# Altium footprint library My Library.PcbLib: 872 footprints (part 43 of 55)
Each footprint in its own frame and in the unit in brackets; x right, y up, seen from the top. Pads: shape width x height; smd on the part's side, far side on the other; paste and mask are expansions set on the pad; w line width, h text height; cw(c..) or ccw(c..) is an arc to the next point about the centre after c.
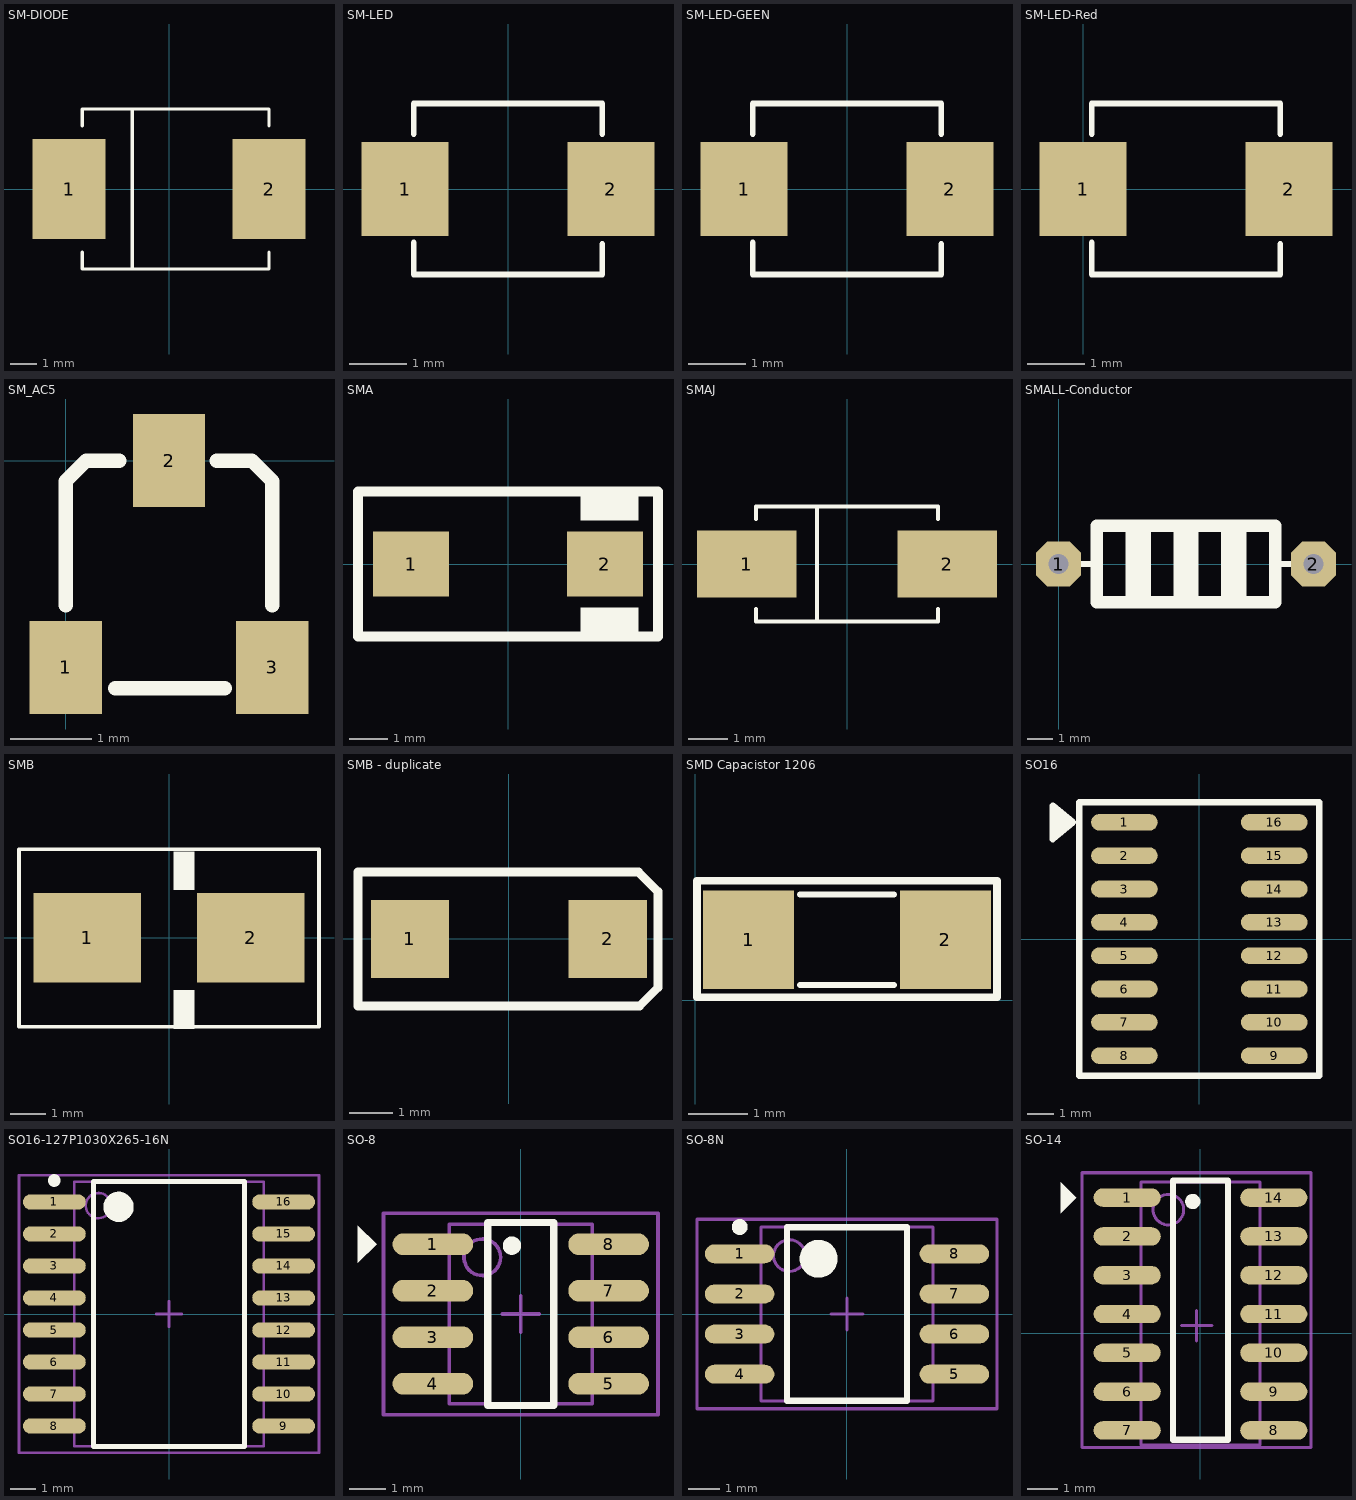
[diagram p42: the footprints below, top view; thin cyan lines are the x and y axes]

## SM-DIODE [mil] "Magnetic-Core Inductor with Winding Polarity Marking; 2 Leads"
pads (2):
  rect 110x150 smd: 1(-150,0) 2(150,0)
Top Overlay:
  lines w5: -130,-95 -130,-120 150,-120 150,-95 ; -130,95 -130,120 150,120 150,95 ; -55,-120 -55,120
Mechanical 1:
  lines w1: -130,-120 150,-120 ; -130,120 150,120
3D body "SW3DPS-DIOD SMD 10BF10-DEFAULT.STEP": height 96.27, standoff 0.6, extent -103.33,-72.86 105.33,68.87

## SM-LED [mil] "Compoment SMD 120x60mil"
height 50
pads (2):
  rect 60x65 smd: 1(-71,0) 2(71,0)
Top Overlay:
  lines w4: -65,-37 -65,-59 65,-59 65,-38 ; -65,38 -65,59 65,59 65,38

## SM-LED-GEEN [mil] "Compoment SMD 120x60mil"
height 50
pads (2):
  rect 60x65 smd: 1(-71,0) 2(71,0)
Top Overlay:
  lines w4: -65,-37 -65,-59 65,-59 65,-38 ; -65,38 -65,59 65,59 65,38
3D body "SW3dPS-LED1206G.STEP": height 43.81, standoff -15.9, extent -63,-32 63,31

## SM-LED-Red [mil]
pads (2):
  rect 60x65 smd: 1(0,0) 2(142,0)
Top Overlay:
  lines w4: 6,-37 6,-59 136,-59 136,-38 ; 6,38 6,59 136,59 136,38
3D body "SW3dPS-LED1206G.STEP": height 43.81, standoff -15.9, extent 10,-32 136,31

## SM_AC5 [mil]
pads (3):
  rect 35x45 smd: 1(0,-100) 2(50,0) 3(100,-100)
Top Overlay:
  lines w7: 0,-70 0,-10 10,0 26,0 ; 24,-110 77,-110 ; 73,0 90,0 100,-10 100,-70

## SMA [mm]
pads (2):
  rect 2x1.7 smd: 1(-2.544,0) 2(2.544,0)
Top Overlay:
  rectangle: 1.905,-1.905 3.429,-1.145
  region: 3.429,1.905 1.905,1.905 1.905,1.145 3.429,1.145
  lines w0.254: -3.937,-1.903 3.937,-1.903 3.937,1.903 -3.937,1.903 -3.937,-1.903
3D body: height 0.2, standoff 0, extent 2.032,-0.864 2.87,0.864
3D body: height 1.14, standoff 0, extent 2.718,-0.864 2.87,0.864
3D body: height 1.14, standoff 0.94, extent 2.489,-0.864 2.87,0.864
3D body: height 2.29, standoff 0.2, extent 2.032,-0.864 2.642,0.864
3D body: height 2.29, standoff 0.2, extent -2.642,-0.864 -2.032,0.864
3D body: height 1.14, standoff 0.94, extent -2.87,-0.864 -2.489,0.864
3D body: height 1.14, standoff 0, extent -2.87,-0.864 -2.718,0.864
3D body: height 0.2, standoff 0, extent -2.87,-0.864 -2.032,0.864
3D body: height 2.29, standoff 0.2, extent -2.64,-1.395 2.642,1.395

## SMAJ [mm] "SMAJ5.0A/CA,SMAJ24CA..."
pads (2):
  rect 2.52x1.7 smd: 1(-2.535,0) 2(2.535,0)
Top Overlay:
  lines w0.102: -2.3,-1.143 -2.3,-1.46 2.3,-1.46 2.3,-1.143 ; -2.3,1.143 -2.3,1.46 2.3,1.46 2.3,1.143 ; -0.762,-1.46 -0.762,1.46
3D body: height 1.31, standoff 0, extent 1.27,-0.889 2.54,0.889
3D body: height 1.31, standoff 0, extent -2.54,-0.889 -1.27,0.889
3D body: height 2.62, standoff 0.2, extent -2.3,-1.46 2.3,1.46

## SMALL-Conductor [mm] "Small value conductor"
pads (2):
  oct 1.8x1.8 hole 0.8: 1(0,0) 2(10.16,0)
Top Overlay:
  rectangle: 4.572,-1.524 5.588,1.524
  rectangle: 2.667,-1.524 3.683,1.524
  rectangle: 6.477,-1.524 7.493,1.524
  lines w0.254: 0,0 1.524,0 ; 8.89,0 10.16,0
  lines w0.5: 1.524,-1.524 8.636,-1.524 8.636,1.524 1.524,1.524 1.524,-1.524

## SMB [mm]
pads (2):
  rect 3x2.5 smd: 1(-2.286,0) 2(2.286,0)
Top Overlay:
  rectangle: 0.127,1.332 0.711,2.413
  region: 0.711,-1.459 0.127,-1.459 0.127,-2.54 0.711,-2.54
  lines w0.102: -4.191,-2.478 -4.191,2.478 4.191,2.478 4.191,-2.478 -4.191,-2.478
3D body: height 2.29, standoff 0.2, extent -2.286,-1.97 2.286,1.97
3D body: height 0.2, standoff 0, extent -2.794,-1.245 -1.295,1.245
3D body: height 1.14, standoff 0, extent -2.794,-1.245 -2.667,1.245
3D body: height 1.14, standoff 0.94, extent -2.794,-1.245 -2.286,1.245
3D body: height 2.29, standoff 0.2, extent -2.286,-1.245 -1.295,1.245
3D body: height 2.29, standoff 0.2, extent 1.295,-1.245 2.286,1.27
3D body: height 1.14, standoff 0.94, extent 2.286,-1.245 2.794,1.27
3D body: height 1.14, standoff 0, extent 2.591,-1.245 2.794,1.27
3D body: height 0.2, standoff 0, extent 1.295,-1.245 2.794,1.27
3D body: height 2.3, standoff 2.29, extent 0.127,-2.021 0.711,1.905

## SMB - duplicate [mil]
pads (2):
  rect 70x70 smd: 1(-88.58,0) 2(88.58,0)
Top Overlay:
  lines w7.87: -135,-60 -135,60 116,60 133.54,42.46 133.54,0 133.54,-43.46 117,-60 -135,-60
3D body "SW3dPS-DO-214AC SMA.STEP": height 95.17, standoff 0.48, extent -102.36,-51.19 102.37,51.17

## SMD Capacistor 1206 [mil]
pads (2):
  rect 60x65 smd: 1(35,40) 2(165,40)
Top Overlay:
  lines w4: 69,10 131,10 ; 69,70 131,70
  lines w5: 1,2 199,2 199,79 1,79 1,2
3D body "SW3dPS-smt_resistor_packages.STEP": height 24.02, standoff -0.39, extent 60.24,15 139.76,65

## SO16 [mm]
pads (16):
  oval 2.54x0.635 smd: 1(-2.854,4.445) 2(-2.854,3.175) 3(-2.854,1.905) 4(-2.854,0.635) 5(-2.854,-0.635) 6(-2.854,-1.905) 7(-2.854,-3.175) 8(-2.854,-4.445) 9(2.854,-4.445) 10(2.854,-3.175) 11(2.854,-1.905) 12(2.854,-0.635) 13(2.854,0.635) 14(2.854,1.905) 15(2.854,3.175) 16(2.854,4.445)
Top Overlay:
  region: -4.826,4.445 -5.588,5.08 -5.588,3.81
  lines w0.254: -5.588,3.81 -5.588,5.08 -4.826,4.445 -5.588,3.81 ; -4.572,-5.207 -4.572,5.207 4.572,5.207 4.572,-5.207 -4.572,-5.207
3D body: height 1.75, standoff 0, extent -1.95,-4.95 1.95,4.95
3D body: height 0.2, standoff 0, extent -3.475,4.204 -2.779,4.696
3D body: height 0.9, standoff 0, extent -2.779,4.204 -2.454,4.696
3D body: height 0.9, standoff 0.7, extent -2.454,4.204 -1.415,4.696
3D body: height 0.9, standoff 0.7, extent -2.454,2.934 -1.415,3.426
3D body: height 0.9, standoff 0, extent -2.779,2.934 -2.454,3.426
3D body: height 0.2, standoff 0, extent -3.475,2.934 -2.779,3.426
3D body: height 0.2, standoff 0, extent -3.475,0.394 -2.779,0.886
3D body: height 0.9, standoff 0, extent -2.779,0.394 -2.454,0.886
3D body: height 0.9, standoff 0.7, extent -2.454,0.394 -1.415,0.886
3D body: height 0.9, standoff 0.7, extent -2.454,1.664 -1.415,2.156
3D body: height 0.9, standoff 0, extent -2.779,1.664 -2.454,2.156
3D body: height 0.2, standoff 0, extent -3.475,1.664 -2.779,2.156
3D body: height 0.2, standoff 0, extent -3.475,-2.146 -2.779,-1.654
3D body: height 0.9, standoff 0, extent -2.779,-2.146 -2.454,-1.654
3D body: height 0.9, standoff 0.7, extent -2.454,-2.146 -1.415,-1.654
3D body: height 0.9, standoff 0.7, extent -2.454,-0.876 -1.415,-0.384
3D body: height 0.9, standoff 0, extent -2.779,-0.876 -2.454,-0.384
3D body: height 0.2, standoff 0, extent -3.475,-0.876 -2.779,-0.384
3D body: height 0.2, standoff 0, extent -3.475,-4.686 -2.779,-4.194
3D body: height 0.9, standoff 0, extent -2.779,-4.686 -2.454,-4.194
3D body: height 0.9, standoff 0.7, extent -2.454,-4.686 -1.415,-4.194
3D body: height 0.9, standoff 0.7, extent -2.454,-3.416 -1.415,-2.924
3D body: height 0.9, standoff 0, extent -2.779,-3.416 -2.454,-2.924
3D body: height 0.2, standoff 0, extent -3.475,-3.416 -2.779,-2.924
3D body: height 0.2, standoff 0, extent 2.779,2.924 3.475,3.416
3D body: height 0.9, standoff 0, extent 2.454,2.924 2.779,3.416
3D body: height 0.9, standoff 0.7, extent 1.415,2.924 2.454,3.416
3D body: height 0.9, standoff 0.7, extent 1.415,4.194 2.454,4.686
3D body: height 0.9, standoff 0, extent 2.454,4.194 2.779,4.686
3D body: height 0.2, standoff 0, extent 2.779,4.194 3.475,4.686
3D body: height 0.2, standoff 0, extent 2.779,0.384 3.475,0.876
3D body: height 0.9, standoff 0, extent 2.454,0.384 2.779,0.876
3D body: height 0.9, standoff 0.7, extent 1.415,0.384 2.454,0.876
3D body: height 0.9, standoff 0.7, extent 1.415,1.654 2.454,2.146
3D body: height 0.9, standoff 0, extent 2.454,1.654 2.779,2.146
3D body: height 0.2, standoff 0, extent 2.779,1.654 3.475,2.146
3D body: height 0.2, standoff 0, extent 2.779,-2.156 3.475,-1.664
3D body: height 0.9, standoff 0, extent 2.454,-2.156 2.779,-1.664
3D body: height 0.9, standoff 0.7, extent 1.415,-2.156 2.454,-1.664
3D body: height 0.9, standoff 0.7, extent 1.415,-0.886 2.454,-0.394
3D body: height 0.9, standoff 0, extent 2.454,-0.886 2.779,-0.394
3D body: height 0.2, standoff 0, extent 2.779,-0.886 3.475,-0.394
3D body: height 0.2, standoff 0, extent 2.779,-3.426 3.475,-2.934
3D body: height 0.9, standoff 0, extent 2.454,-3.426 2.779,-2.934
3D body: height 0.9, standoff 0.7, extent 1.415,-3.426 2.454,-2.934
3D body: height 0.9, standoff 0.7, extent 1.415,-4.696 2.454,-4.204
3D body: height 0.9, standoff 0, extent 2.454,-4.696 2.779,-4.204
3D body: height 0.2, standoff 0, extent 2.779,-4.696 3.475,-4.204

## SO16-127P1030X265-16N [mm] "SOIC, 16-Leads, Body 10.5x7.5mm (max), Pitch 1.27mm, IPC Medium Density"
height 2.65
pads (16):
  oval 2.5x0.6 smd: 1(-4.55,4.445) 2(-4.55,3.175) 3(-4.55,1.905) 4(-4.55,0.635) 5(-4.55,-0.635) 6(-4.55,-1.905) 7(-4.55,-3.175) 8(-4.55,-4.445) 9(4.55,-4.445) 10(4.55,-3.175) 11(4.55,-1.905) 12(4.55,-0.635) 13(4.55,0.635) 14(4.55,1.905) 15(4.55,3.175) 16(4.55,4.445)
Top Overlay:
  circle w0.25: c-4.55,5.295 r0.125
  circle w0.6: c-2,4.25 r0.3
  lines w0.2: -3,-5.25 -3,5.25 3,5.25 3,-5.25 -3,-5.25
Mechanical 13:
  circle w0.1: c-2.8,4.3 r0.5
  lines w0.1: -3.75,-5.25 -3.75,5.25 3.75,5.25 3.75,-5.25 -3.75,-5.25
Mechanical 15:
  lines w0.1: -0.5,0 0.5,0 ; 0,-0.5 0,0.5 ; -5.95,-5.5 -5.95,5.5 5.95,5.5 5.95,-5.5 -5.95,-5.5
3D body: height 1.38, standoff 1.28, extent -4.207,-4.699 -3.775,-4.191
3D body: height 1.38, standoff 0, extent -4.309,-4.699 -4.207,-4.191
3D body: height 0.1, standoff 0, extent -5.147,-4.699 -4.309,-4.191
3D body: height 1.38, standoff 1.28, extent -4.207,-3.429 -3.775,-2.921
3D body: height 1.38, standoff 0, extent -4.309,-3.429 -4.207,-2.921
3D body: height 0.1, standoff 0, extent -5.147,-3.429 -4.309,-2.921
3D body: height 1.38, standoff 1.28, extent -4.207,-2.159 -3.775,-1.651
3D body: height 1.38, standoff 0, extent -4.309,-2.159 -4.207,-1.651
3D body: height 0.1, standoff 0, extent -5.147,-2.159 -4.309,-1.651
3D body: height 1.38, standoff 1.28, extent -4.207,-0.889 -3.775,-0.381
3D body: height 1.38, standoff 0, extent -4.309,-0.889 -4.207,-0.381
3D body: height 0.1, standoff 0, extent -5.147,-0.889 -4.309,-0.381
3D body: height 1.38, standoff 1.28, extent -4.207,0.381 -3.775,0.889
3D body: height 1.38, standoff 0, extent -4.309,0.381 -4.207,0.889
3D body: height 0.1, standoff 0, extent -5.147,0.381 -4.309,0.889
3D body: height 1.38, standoff 1.28, extent -4.207,1.651 -3.775,2.159
3D body: height 1.38, standoff 0, extent -4.309,1.651 -4.207,2.159
3D body: height 0.1, standoff 0, extent -5.147,1.651 -4.309,2.159
3D body: height 1.38, standoff 1.28, extent -4.207,2.921 -3.775,3.429
3D body: height 1.38, standoff 0, extent -4.309,2.921 -4.207,3.429
3D body: height 0.1, standoff 0, extent -5.147,2.921 -4.309,3.429
3D body: height 1.38, standoff 1.28, extent -4.207,4.191 -3.775,4.699
3D body: height 1.38, standoff 0, extent -4.309,4.191 -4.207,4.699
3D body: height 0.1, standoff 0, extent -5.147,4.191 -4.309,4.699
3D body: height 1.38, standoff 1.28, extent 3.801,0.381 4.233,0.889
3D body: height 1.38, standoff 0, extent 4.233,0.381 4.334,0.889
3D body: height 0.1, standoff 0, extent 4.334,0.381 5.172,0.889
3D body: height 1.38, standoff 1.28, extent 3.801,-0.889 4.233,-0.381
3D body: height 1.38, standoff 0, extent 4.233,-0.889 4.334,-0.381
3D body: height 0.1, standoff 0, extent 4.334,-0.889 5.172,-0.381
3D body: height 1.38, standoff 1.28, extent 3.775,-2.159 4.207,-1.651
3D body: height 1.38, standoff 0, extent 4.207,-2.159 4.309,-1.651
3D body: height 0.1, standoff 0, extent 4.309,-2.159 5.147,-1.651
3D body: height 1.38, standoff 1.28, extent 3.775,-3.429 4.207,-2.921
3D body: height 1.38, standoff 0, extent 4.207,-3.429 4.309,-2.921
3D body: height 0.1, standoff 0, extent 4.309,-3.429 5.147,-2.921
3D body: height 1.38, standoff 1.28, extent 3.775,-4.699 4.207,-4.191
3D body: height 1.38, standoff 0, extent 4.207,-4.699 4.309,-4.191
3D body: height 0.1, standoff 0, extent 4.309,-4.699 5.147,-4.191
3D body: height 1.38, standoff 1.28, extent 3.775,-0.889 4.207,-0.381
3D body: height 1.38, standoff 0, extent 4.207,-0.889 4.309,-0.381
3D body: height 0.1, standoff 0, extent 4.309,-0.889 5.147,-0.381
3D body: height 1.38, standoff 1.28, extent 3.775,0.381 4.207,0.889
3D body: height 1.38, standoff 0, extent 4.207,0.381 4.309,0.889
3D body: height 0.1, standoff 0, extent 4.309,0.381 5.147,0.889
3D body: height 1.38, standoff 1.28, extent 3.775,1.651 4.207,2.159
3D body: height 1.38, standoff 0, extent 4.207,1.651 4.309,2.159
3D body: height 0.1, standoff 0, extent 4.309,1.651 5.147,2.159
3D body: height 1.38, standoff 1.28, extent 3.775,2.921 4.207,3.429
3D body: height 1.38, standoff 0, extent 4.207,2.921 4.309,3.429
3D body: height 0.1, standoff 0, extent 4.309,2.921 5.147,3.429
3D body: height 1.38, standoff 1.28, extent 3.775,4.191 4.207,4.699
3D body: height 1.38, standoff 0, extent 4.207,4.191 4.309,4.699
3D body: height 0.1, standoff 0, extent 4.309,4.191 5.147,4.699
3D body: height 2.65, standoff 0.1, extent -3.75,-5.25 3.75,5.25

## SO-8 [mm] "8-Pin Small Outline Integrated Circuit 1.27 mm Pitch, IPC Medium Density"
height 1.75
pads (8):
  oval 2.2x0.6 smd: 1(-2.4,1.905) 2(-2.4,0.635) 3(-2.4,-0.635) 4(-2.4,-1.905) 5(2.4,-1.905) 6(2.4,-0.635) 7(2.4,0.635) 8(2.4,1.905)
Top Overlay:
  circle w0.25: c-0.241,1.866 r0.125
  region: -4.445,1.397 -3.937,1.905 -4.445,2.413
  lines w0.2: -0.9,-2.5 0.9,-2.5 0.9,2.5 -0.9,2.5 -0.9,-2.5
Mechanical 13:
  circle w0.1: c-1.05,1.55 r0.5
  lines w0.1: -1.95,-2.45 1.95,-2.45 1.95,2.45 -1.95,2.45 -1.95,-2.45
Mechanical 15:
  lines w0.1: -0.5,0 0.5,0 ; 0,-0.5 0,0.5 ; -3.75,-2.75 3.75,-2.75 3.75,2.75 -3.75,2.75 -3.75,-2.75
3D body "User Library-sop-8.STEP": height 1.6, standoff 0, extent -2.894,-2.434 3.148,2.586

## SO-8N [mm] "SOP, 8-Leads, Body 5.3x5.3mm, Pitch 1.27mm, IPC Medium Density"
height 2.03
pads (8):
  oval 2.2x0.6 smd: 1(-3.4,1.905) 2(-3.4,0.635) 3(-3.4,-0.635) 4(-3.4,-1.905) 5(3.4,-1.905) 6(3.4,-0.635) 7(3.4,0.635) 8(3.4,1.905)
Top Overlay:
  circle w0.25: c-3.4,2.755 r0.125
  circle w0.6: c-0.9,1.75 r0.3
  lines w0.2: -1.9,-2.75 -1.9,2.75 1.9,2.75 1.9,-2.75 -1.9,-2.75
Mechanical 13:
  circle w0.1: c-1.825,1.85 r0.5
  lines w0.1: -2.725,-2.75 -2.725,2.75 2.725,2.75 2.725,-2.75 -2.725,-2.75
Mechanical 15:
  lines w0.1: -0.5,0 0.5,0 ; 0,-0.5 0,0.5 ; -4.75,-3 -4.75,3 4.75,3 4.75,-3 -4.75,-3
3D body "User Library-sop-8.STEP": height 1.6, standoff 0, extent -3.046,-2.535 2.996,2.485

## SO-14 [mm] "SOIC, 14-Leads, Body 9.9x3.9mm, Pitch 1.27mm, IPC Medium Density"
height 1.75
pads (14):
  oval 2.2x0.6 smd: 1(-2.4,4.445) 2(-2.4,3.175) 3(-2.4,1.905) 4(-2.4,0.635) 5(-2.4,-0.635) 6(-2.4,-1.905) 7(-2.4,-3.175) 8(2.4,-3.175) 9(2.4,-1.905) 10(2.4,-0.635) 11(2.4,0.635) 12(2.4,1.905) 13(2.4,3.175) 14(2.4,4.445)
Top Overlay:
  circle w0.25: c-0.252,4.318 r0.125
  region: -4.572,3.937 -4.064,4.445 -4.572,4.953
  lines w0.2: -0.9,-3.48 -0.9,5 0.9,5 0.9,-3.48 -0.9,-3.48
Mechanical 13:
  circle w0.1: c-1.05,4.05 r0.5
  lines w0.1: -1.95,-3.658 -1.95,4.95 1.95,4.95 1.95,-3.658 -1.95,-3.658
Mechanical 15:
  lines w0.1: -0.627,0.254 0.373,0.254 ; -0.127,-0.246 -0.127,0.754 ; -3.877,-3.734 -3.877,5.258 3.623,5.258 3.623,-3.734 -3.877,-3.734
3D body "User Library-SOP14-p127-780.STEP": height 1.1, standoff 0, extent -3.708,-4.474 3.592,5.726